# Altium integrated library uPC RAM ROM.IntLib: 33 symbols
Pins are listed as number, name and electrical type; pins without a type are passive.

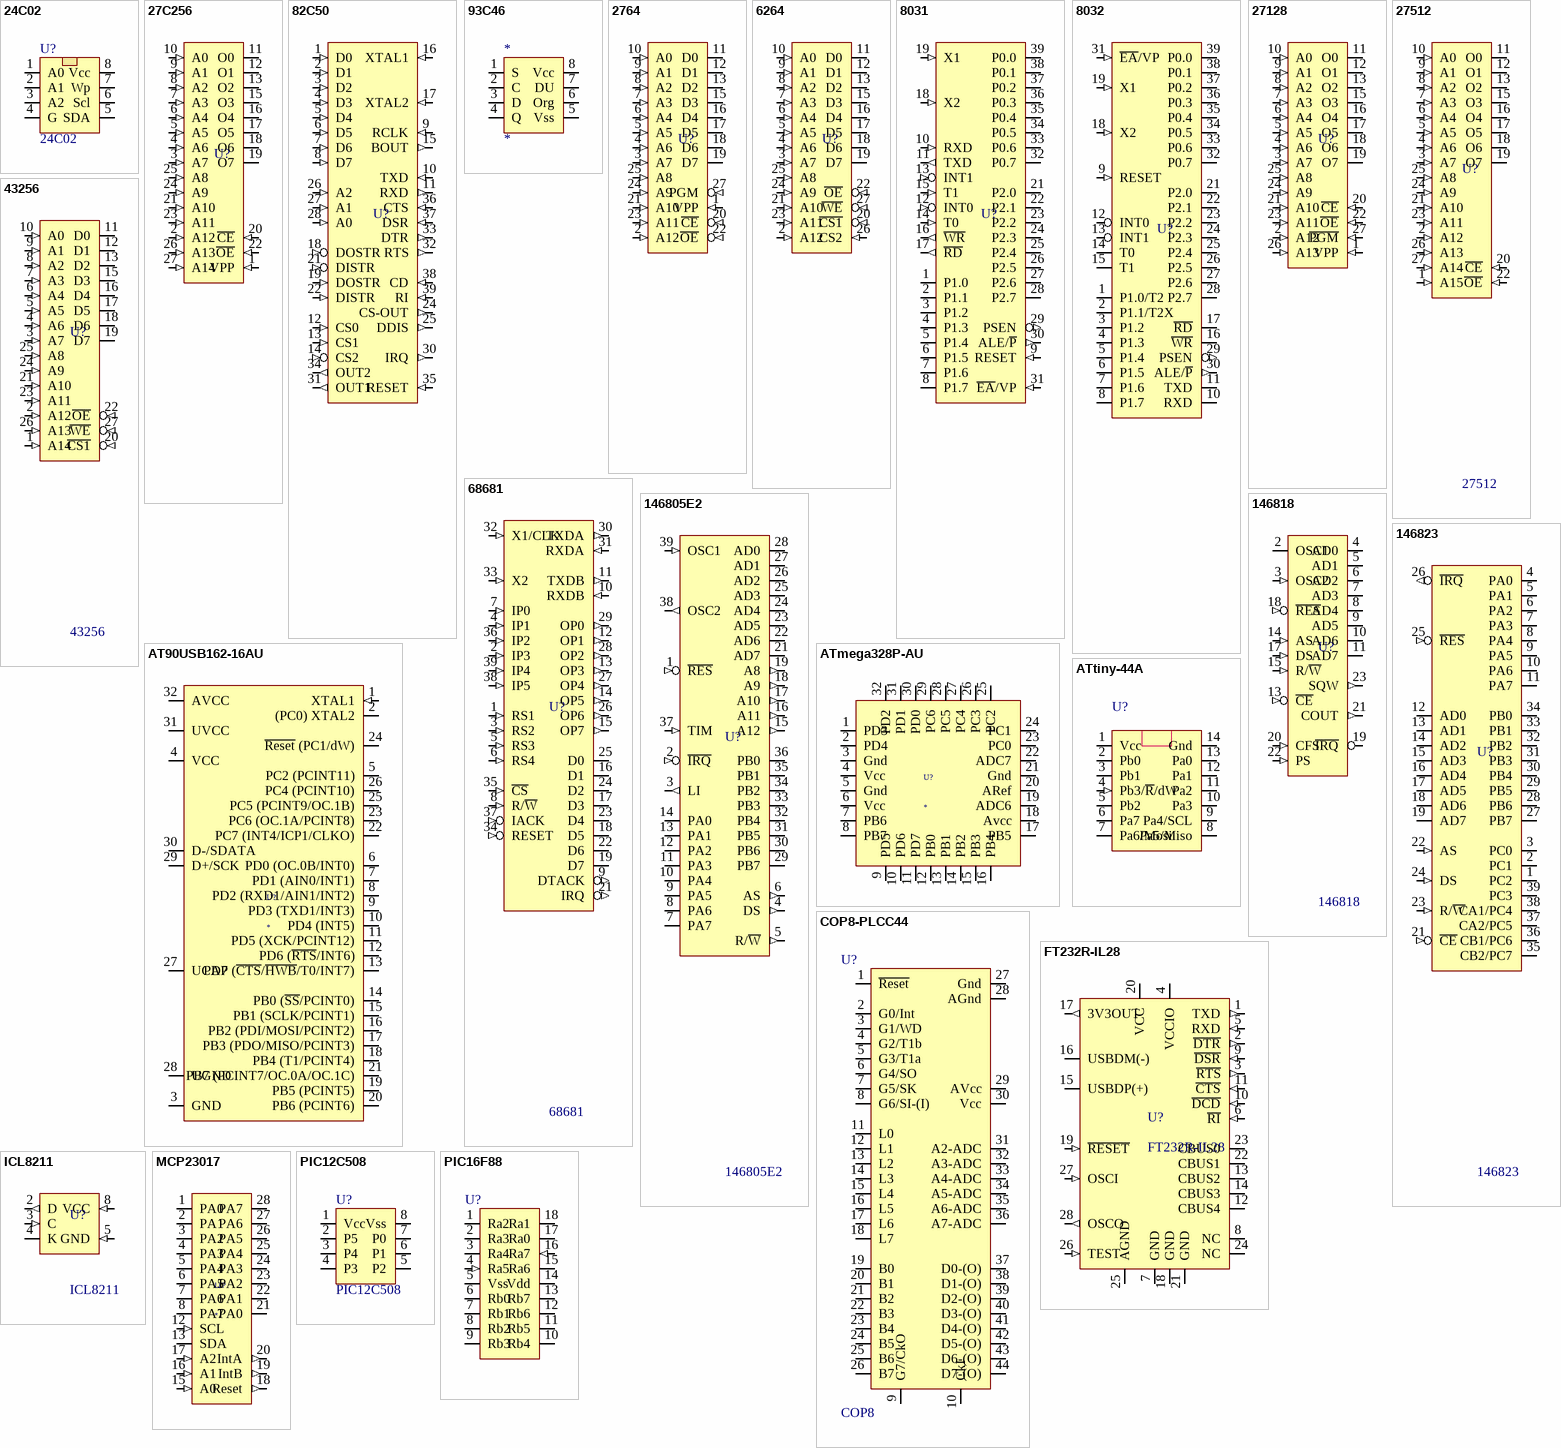
[diagram p0: symbols 24C02 to PIC16F88]

## 24C02
designator U?
footprint SO8-150
pins: 1 A0, 2 A1, 3 A2, 4 G, 5 SDA, 6 Scl, 7 Wp, 8 Vcc

## 27C256
designator U?
footprint DIL28-600
pins: 1 VPP (in), 2 A12 (in), 3 A7 (in), 4 A6 (in), 5 A5 (in), 6 A4 (in), 7 A3 (in), 8 A2 (in), 9 A1 (in), 10 A0 (in), 11 O0 (hiz), 12 O1 (hiz), 13 O2 (hiz), 14 GND (power) hidden to GND, 15 O3 (hiz), 16 O4 (hiz), 17 O5 (hiz), 18 O6 (hiz), 19 O7 (hiz), 20 ~{CE} (in), 21 A10 (in), 22 ~{OE} (in), 23 A11 (in), 24 A9 (in), 25 A8 (in), 26 A13 (in), 27 A14 (in), 28 VCC (power) hidden to VCC

## 82C50
designator U?
footprint DIL40-600
pins: 1 D0 (in), 2 D1 (in), 3 D2 (in), 4 D3 (in), 5 D4 (in), 6 D5 (in), 7 D6 (in), 8 D7 (in), 9 RCLK (in), 10 TXD (in), 11 RXD (out), 12 CS0 (in), 13 CS1 (in), 14 CS2 (in), 15 BOUT (out), 16 XTAL1 (in), 17 XTAL2 (in), 18 DOSTR (in), 19 DOSTR (in), 20 VSS (power) hidden to VSS, 21 DISTR (in), 22 DISTR (in), 24 CS-OUT (out), 25 DDIS (out), 26 A2 (in), 27 A1 (in), 28 A0 (in), 30 IRQ (out), 31 OUT1 (out), 32 RTS (out), 33 DTR (out), 34 OUT2 (out), 35 RESET (in), 36 CTS (in), 37 DSR (in), 38 CD (in), 39 RI (in), 40 VCC (power) hidden to VCC

## 93C46
designator *
footprint DIL8-300a
pins: 1 S, 2 C, 3 D, 4 Q, 5 Vss, 6 Org, 7 DU, 8 Vcc

## 2764
designator U?
footprint DIL28-600
pins: 1 VPP (in), 2 A12 (in), 3 A7 (in), 4 A6 (in), 5 A5 (in), 6 A4 (in), 7 A3 (in), 8 A2 (in), 9 A1 (in), 10 A0 (in), 11 D0 (hiz), 12 D1 (hiz), 13 D2 (hiz), 14 GND (power) hidden to GND, 15 D3 (hiz), 16 D4 (hiz), 17 D5 (hiz), 18 D6 (hiz), 19 D7 (hiz), 20 ~{CE} (in), 21 A10 (in), 22 ~{OE} (in), 23 A11 (in), 24 A9 (in), 25 A8 (in), 27 PGM (in), 28 VCC (power) hidden to VCC

## 6264
designator U?
footprint DIL28-600
pins: 2 A12 (in), 3 A7 (in), 4 A6 (in), 5 A5 (in), 6 A4 (in), 7 A3 (in), 8 A2 (in), 9 A1 (in), 10 A0 (in), 11 D0 (hiz), 12 D1 (hiz), 13 D2 (hiz), 14 GND (power) hidden to GND, 15 D3 (hiz), 16 D4 (hiz), 17 D5 (hiz), 18 D6 (hiz), 19 D7 (hiz), 20 ~{CS1} (in), 21 A10 (in), 22 ~{OE} (in), 23 A11 (in), 24 A9 (in), 25 A8 (in), 26 CS2 (in), 27 ~{WE} (in), 28 VCC (power) hidden to VCC

## 8031
designator U?
footprint DIL40-600
pins: 1 P1.0 (io), 2 P1.1 (io), 3 P1.2 (io), 4 P1.3 (io), 5 P1.4 (io), 6 P1.5 (io), 7 P1.6 (io), 8 P1.7 (io), 9 RESET (in), 10 RXD (in), 11 TXD (out), 12 INT0 (in), 13 INT1 (in), 14 T0 (in), 15 T1 (in), 16 ~{WR} (out), 17 ~{RD} (out), 18 X2 (in), 19 X1 (in), 20 GND (power) hidden to GND, 21 P2.0 (io), 22 P2.1 (io), 23 P2.2 (io), 24 P2.3 (io), 25 P2.4 (io), 26 P2.5 (io), 27 P2.6 (io), 28 P2.7 (io), 29 PSEN (out), 30 ALE/~{P} (out), 31 ~{EA}/VP (in), 32 P0.7 (io), 33 P0.6 (io), 34 P0.5 (io), 35 P0.4 (io), 36 P0.3 (io), 37 P0.2 (io), 38 P0.1 (io), 39 P0.0 (io), 40 VCC (power) hidden to VCC

## 8032
designator U?
footprint DIL40-600
pins: 1 P1.0/T2 (io), 2 P1.1/T2X (io), 3 P1.2 (io), 4 P1.3 (io), 5 P1.4 (io), 6 P1.5 (io), 7 P1.6 (io), 8 P1.7 (io), 9 RESET (in), 10 RXD (io), 11 TXD (io), 12 INT0 (io), 13 INT1 (io), 14 T0 (io), 15 T1 (io), 16 ~{WR} (io), 17 ~{RD} (io), 18 X2 (in), 19 X1 (in), 20 VSS (power) hidden to VSS, 21 P2.0 (io), 22 P2.1 (io), 23 P2.2 (io), 24 P2.3 (io), 25 P2.4 (io), 26 P2.5 (io), 27 P2.6 (io), 28 P2.7 (io), 29 PSEN (out), 30 ALE/~{P} (out), 31 ~{EA}/VP (in), 32 P0.7 (io), 33 P0.6 (io), 34 P0.5 (io), 35 P0.4 (io), 36 P0.3 (io), 37 P0.2 (io), 38 P0.1 (io), 39 P0.0 (io), 40 VDD (power) hidden to VDD

## 27128
designator U?
footprint DIL28-600
pins: 1 VPP (in), 2 A12 (in), 3 A7 (in), 4 A6 (in), 5 A5 (in), 6 A4 (in), 7 A3 (in), 8 A2 (in), 9 A1 (in), 10 A0 (in), 11 O0 (hiz), 12 O1 (hiz), 13 O2 (hiz), 14 GND (power) hidden to GND, 15 O3 (hiz), 16 O4 (hiz), 17 O5 (hiz), 18 O6 (hiz), 19 O7 (hiz), 20 ~{CE} (in), 21 A10 (in), 22 ~{OE} (in), 23 A11 (in), 24 A9 (in), 25 A8 (in), 26 A13 (in), 27 ~{PGM} (in), 28 VCC (power) hidden to VCC

## 27512
designator U?
footprint DIL28-600
pins: 1 A15 (in), 2 A12 (in), 3 A7 (in), 4 A6 (in), 5 A5 (in), 6 A4 (in), 7 A3 (in), 8 A2 (in), 9 A1 (in), 10 A0 (in), 11 O0 (hiz), 12 O1 (hiz), 13 O2 (hiz), 14 GND (power) hidden to GND, 15 O3 (hiz), 16 O4 (hiz), 17 O5 (hiz), 18 O6 (hiz), 19 O7 (hiz), 20 ~{CE} (in), 21 A10 (in), 22 ~{OE} (in), 23 A11 (in), 24 A9 (in), 25 A8 (in), 26 A13 (in), 27 A14 (in), 28 VCC (power) hidden to VCC

## 43256
designator U?
footprint DIL28-600
pins: 1 A14 (in), 2 A12 (in), 3 A7 (in), 4 A6 (in), 5 A5 (in), 6 A4 (in), 7 A3 (in), 8 A2 (in), 9 A1 (in), 10 A0 (in), 11 D0 (hiz), 12 D1 (hiz), 13 D2 (hiz), 14 GND (power) hidden to GND, 15 D3 (hiz), 16 D4 (hiz), 17 D5 (hiz), 18 D6 (hiz), 19 D7 (hiz), 20 ~{CS1} (in), 21 A10 (in), 22 ~{OE} (in), 23 A11 (in), 24 A9 (in), 25 A8 (in), 26 A13 (in), 27 ~{WE} (in), 28 ACC (power) hidden to ACC

## 68681
designator U?
footprint DIL40-600
pins: 1 RS1 (in), 2 IP3 (in), 3 RS2 (in), 4 IP1 (in), 5 RS3 (in), 6 RS4 (in), 7 IP0 (in), 8 R/~{W} (in), 9 DTACK (out), 10 RXDB (in), 11 TXDB (out), 12 OP1 (out), 13 OP3 (out), 14 OP5 (out), 15 OP7 (out), 16 D1 (io), 17 D3 (io), 18 D5 (io), 19 D7 (io), 20 GND (power) hidden to GND, 21 IRQ (out), 22 D6 (io), 23 D4 (io), 24 D2 (io), 25 D0 (io), 26 OP6 (out), 27 OP4 (out), 28 OP2 (out), 29 OP0 (out), 30 TXDA (out), 31 RXDA (in), 32 X1/CLK (in), 33 X2 (in), 34 RESET (in), 35 ~{CS} (in), 36 IP2 (in), 37 IACK (in), 38 IP5 (in), 39 IP4 (in), 40 VCC (power) hidden to VCC

## 146805E2
designator U?
footprint DIL40-600
pins: 1 ~{RES} (in), 2 ~{IRQ} (in), 3 LI (out), 4 DS (out), 5 R/~{W} (out), 6 AS (out), 7 PA7 (io), 8 PA6 (io), 9 PA5 (io), 10 PA4 (io), 11 PA3 (io), 12 PA2 (io), 13 PA1 (io), 14 PA0 (io), 15 A12 (out), 16 A11 (out), 17 A10 (out), 18 A9 (out), 19 A8 (out), 20 GND (power) hidden to GND, 21 AD7 (io), 22 AD6 (io), 23 AD5 (io), 24 AD4 (io), 25 AD3 (io), 26 AD2 (io), 27 AD1 (io), 28 AD0 (io), 29 PB7 (io), 30 PB6 (io), 31 PB5 (io), 32 PB4 (io), 33 PB3 (io), 34 PB2 (io), 35 PB1 (io), 36 PB0 (io), 37 TIM (in), 38 OSC2 (out), 39 OSC1 (in), 40 VCC (power) hidden to VCC

## 146818
designator U?
footprint DIL24-600a
pins: 2 OSC1, 3 OSC2 (in), 4 AD0 (io), 5 AD1 (io), 6 AD2 (io), 7 AD3 (io), 8 AD4 (io), 9 AD5 (io), 10 AD6 (io), 11 AD7 (io), 12 GND (power) hidden to GND, 13 ~{CE} (in), 14 AS (in), 15 R/~{W} (in), 17 DS (in), 18 ~{RES} (in), 19 ~{IRQ} (oc), 20 CFS (in), 21 COUT (out), 22 PS (in), 23 SQW (out), 24 VCC (power) hidden to Vcc

## 146823
designator U?
footprint DIL40-600
pins: 1 PC2 (io), 2 PC1 (io), 3 PC0 (io), 4 PA0 (io), 5 PA1 (io), 6 PA2 (io), 7 PA3 (io), 8 PA4 (io), 9 PA5 (io), 10 PA6 (io), 11 PA7 (io), 12 AD0 (io), 13 AD1 (io), 14 AD2 (io), 15 AD3 (io), 16 AD4 (io), 17 AD5 (io), 18 AD6 (io), 19 AD7 (io), 20 GND (power) hidden to GND, 21 ~{CE} (in), 22 AS (in), 23 R/~{W} (in), 24 DS (in), 25 ~{RES} (in), 26 ~{IRQ} (out), 27 PB7 (io), 28 PB6 (io), 29 PB5 (io), 30 PB4 (io), 31 PB3 (io), 32 PB2 (io), 33 PB1 (io), 34 PB0 (io), 35 CB2/PC7 (io), 36 CB1/PC6 (io), 37 CA2/PC5 (io), 38 CA1/PC4 (io), 39 PC3 (io), 40 VCC (power) hidden to VCC

## AT90USB162-16AU
designator U?
Price: 3.36
footprint TQFP32 7x7x0.8 (Thin QFP, 32-Leads, Body 7x7mm, Pitch 0.8mm, IPC High Density)
pins: 1 XTAL1 (in), 2 (PC0) XTAL2 (io), 3 GND (power), 4 VCC (power), 5 PC2 (PCINT11) (io), 6 PD0 (OC.0B/INT0) (io), 7 PD1 (AIN0/INT1) (io), 8 PD2 (RXD1/AIN1/INT2) (io), 9 PD3 (TXD1/INT3) (io), 10 PD4 (INT5) (io), 11 PD5 (XCK/PCINT12) (io), 12 PD6 (~{RTS}/INT6) (io), 13 PD7 (~{CTS}/~{HWB}/T0/INT7) (io), 14 PB0 (~{SS}/PCINT0) (io), 15 PB1 (SCLK/PCINT1) (io), 16 PB2 (PDI/MOSI/PCINT2) (io), 17 PB3 (PDO/MISO/PCINT3) (io), 18 PB4 (T1/PCINT4) (io), 19 PB5 (PCINT5) (io), 20 PB6 (PCINT6) (io), 21 PB7 (PCINT7/OC.0A/OC.1C) (io), 22 PC7 (INT4/ICP1/CLKO) (io), 23 PC6 (OC.1A/PCINT8) (io), 24 ~{Reset} (PC1/dW) (io), 25 PC5 (PCINT9/OC.1B) (io), 26 PC4 (PCINT10) (io), 27 UCAP (power), 28 UGND (power), 29 D+/SCK (io), 30 D-/SDATA (io), 31 UVCC (power), 32 AVCC (power)
1 alternate drawing of the same symbol

## ATmega328P-AU
designator U?
Price: 3.36
footprint TQFP32 7x7x0.8 (Thin QFP, 32-Leads, Body 7x7mm, Pitch 0.8mm, IPC High Density)
pins: 1 PD3, 2 PD4, 3 Gnd, 4 Vcc, 5 Gnd, 6 Vcc, 7 PB6, 8 PB7, 9 PD5, 10 PD6, 11 PD7, 12 PB0, 13 PB1, 14 PB2, 15 PB3, 16 PB4, 17 PB5, 18 Avcc, 19 ADC6, 20 ARef, 21 Gnd, 22 ADC7, 23 PC0, 24 PC1, 25 PC2, 26 PC3, 27 PC4, 28 PC5, 29 PC6, 30 PD0, 31 PD1, 32 PD2
1 alternate drawing of the same symbol

## ATtiny-44A
designator U?
uPC 8bit/44K
footprint SO14-150
pins: 1 Vcc (io), 2 Pb0 (io), 3 Pb1 (io), 4 Pb3/~{R}/dW (in), 5 Pb2 (power), 6 Pa7 (io), 7 Pa6/Mosi (io), 8 Pa5/Miso (io), 9 Pa4/SCL (io), 10 Pa3 (io), 11 Pa2 (io), 12 Pa1 (io), 13 Pa0 (io), 14 Gnd (power)

## COP8-PLCC44
designator U?, comment COP8
Price: 15.76
footprint PLCC-44 (PLCC; 44 Leads; Body 16.5 x 16.5 mm)
pins: 1 ~{Reset}, 2 G0/Int, 3 G1/WD, 4 G2/T1b, 5 G3/T1a, 6 G4/SO, 7 G5/SK, 8 G6/SI-(I), 9 G7/CkO, 10 CkI, 11 L0, 12 L1, 13 L2, 14 L3, 15 L4, 16 L5, 17 L6, 18 L7, 19 B0, 20 B1, 21 B2, 22 B3, 23 B4, 24 B5, 25 B6, 26 B7, 27 Gnd, 28 AGnd, 29 AVcc, 30 Vcc, 31 A2-ADC, 32 A3-ADC, 33 A4-ADC, 34 A5-ADC, 35 A6-ADC, 36 A7-ADC, 37 D0-(O), 38 D1-(O), 39 D2-(O), 40 D3-(O), 41 D4-(O), 42 D5-(O), 43 D6-(O), 44 D7-(O)

## FT232R-IL28
designator U?
COM-UART; Price: 6.24
footprint SSOP28 (Body Width 5.3mm; Pitch 0.65 mm)
pins: 1 TXD (out), 2 ~{DTR} (out), 3 ~{RTS} (out), 4 VCCIO (power), 5 RXD (in), 6 ~{RI} (in), 7 GND (power), 8 NC, 9 ~{DSR} (in), 10 ~{DCD} (in), 11 ~{CTS} (in), 12 CBUS4 (io), 13 CBUS2 (io), 14 CBUS3 (io), 15 USBDP(+) (io), 16 USBDM(-) (io), 17 3V3OUT (out), 18 GND (power), 19 ~{RESET} (in), 20 VCC (power), 21 GND (power), 22 CBUS1 (io), 23 CBUS0 (io), 24 NC, 25 AGND (power), 26 TEST (in), 27 OSCI (in), 28 OSCO (out)

## ICL8211
designator U?
footprint DIL8-300a
pins: 2 D (out), 3 C (in), 4 K (oc), 5 GND (in), 8 VCC (in)

## MCP23017
designator U?
Price: 2.3
footprint SO28-300
pins: 1 PA0, 2 PA1, 3 PA2, 4 PA3, 5 PA4, 6 PA5, 7 PA6, 8 PA7, 9 Vdd (power) hidden to Vdd, 10 Vss (power) hidden to Vss, 12 SCL (in), 13 SDA (io), 15 A0 (in), 16 A1 (in), 17 A2 (in), 18 Reset (out), 19 IntB (out), 20 IntA (out), 21 PA0, 22 PA1, 23 PA2, 24 PA3, 25 PA4, 26 PA5, 27 PA6, 28 PA7

## PIC12C508
designator U?
footprint DIL8-300a
pins: 1 Vcc, 2 P5, 3 P4, 4 P3, 5 P2, 6 P1, 7 P0, 8 Vss

## PIC16F88
designator U?
uPC
footprint SO18-300
pins: 1 Ra2 (io), 2 Ra3 (io), 3 Ra4 (io), 4 Ra5 (in), 5 Vss (power), 6 Rb0 (io), 7 Rb1 (io), 8 Rb2 (io), 9 Rb3 (io), 10 Rb4 (io), 11 Rb5 (io), 12 Rb6 (io), 13 Rb7 (io), 14 Vdd (power), 15 Ra6 (io), 16 Ra7 (in), 17 Ra0 (io), 18 Ra1 (io)

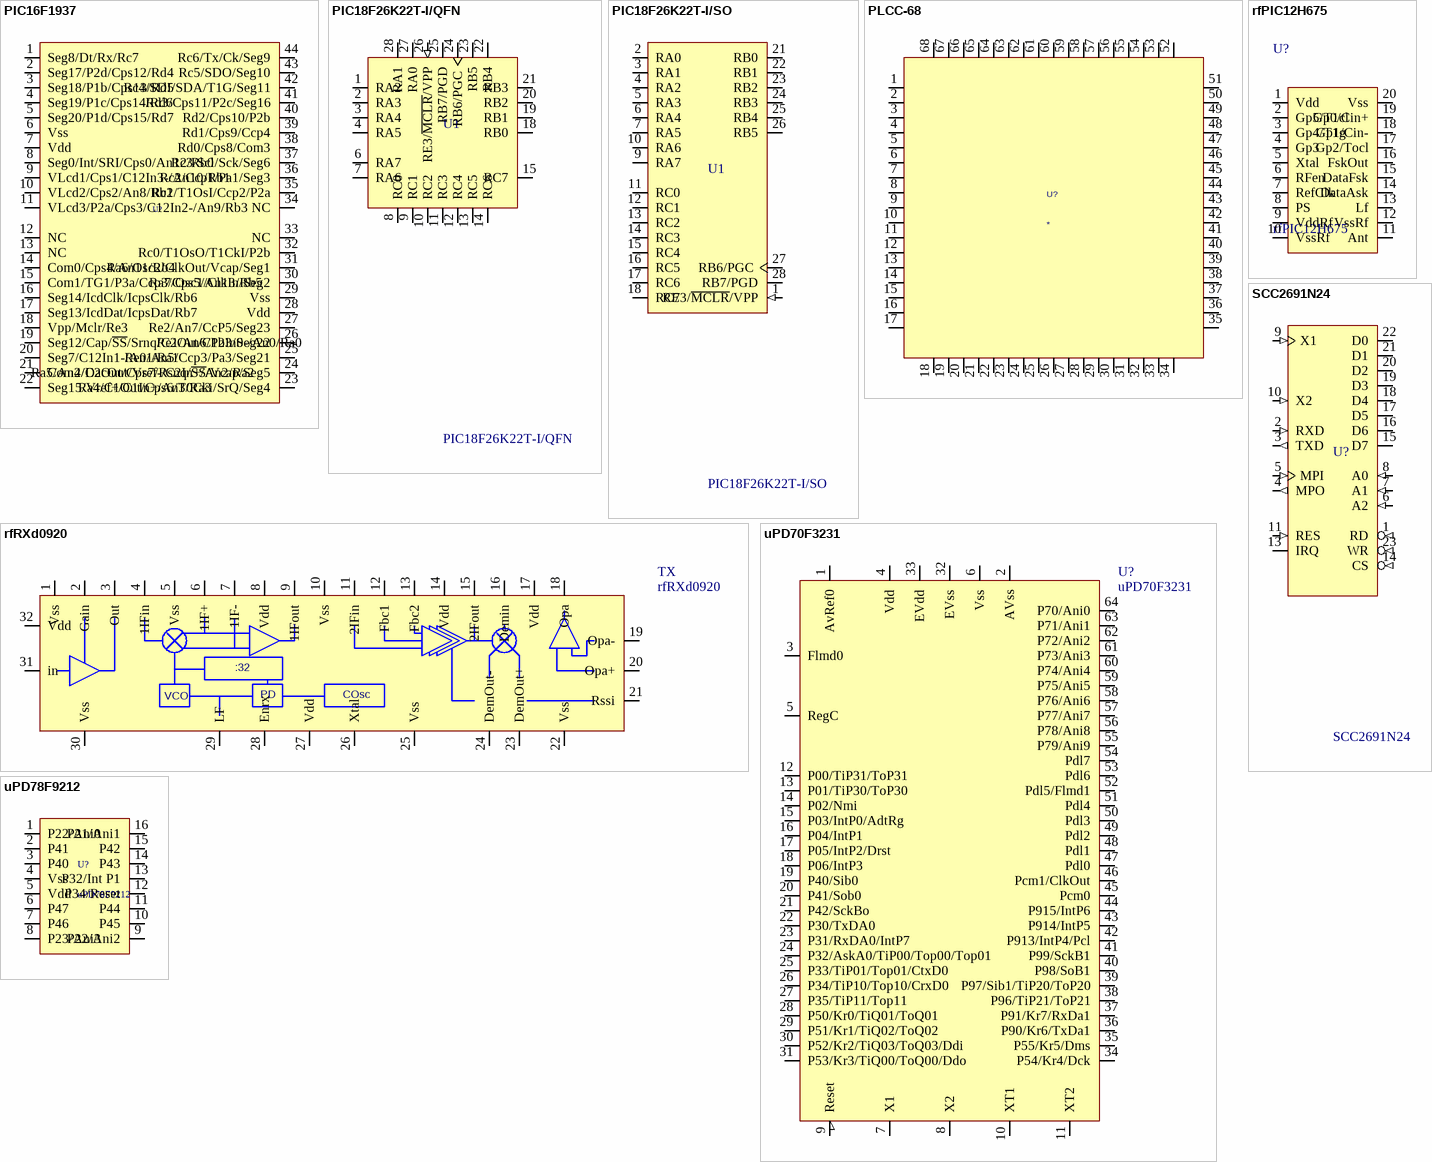
[diagram p1: symbols PIC16F1937 to uPD78F9212]

## PIC16F1937
designator U?
Price: 3.94
footprint TQFP44 10x10x0.8
pins: 1 Seg8/Dt/Rx/Rc7, 2 Seg17/P2d/Cps12/Rd4, 3 Seg18/P1b/Cps13/Rd5, 4 Seg19/P1c/Cps14/Rd6, 5 Seg20/P1d/Cps15/Rd7, 6 Vss, 7 Vdd, 8 Seg0/Int/SRI/Cps0/An12/Rb0, 9 VLcd1/Cps1/C12In3-/An10/Rb1, 10 VLcd2/Cps2/An8/Rb2, 11 VLcd3/P2a/Cps3/C12In2-/An9/Rb3, 12 NC, 13 NC, 14 Com0/Cps4/An11/Rb4, 15 Com1/TG1/P3a/Ccp3/Cps5/An13/Rb5, 16 Seg14/IcdClk/IcpsClk/Rb6, 17 Seg13/IcdDat/IcpsDat/Rb7, 18 Vpp/Mclr/Re3, 19 Seg12/Cap/~{SS}/Srnq/C2Out/C12In0-/An0/Ra0, 20 Seg7/C12In1-/An1/Ra1, 21 Com2/DacOut/Vref-/C2In+/An2/Ra2, 22 Seg15/Vref+/C1In+/An3/Ra3, 23 Ra4/C1Out/Cps6/T0Cki/SrQ/Seg4, 24 Ra5/An4/C2Out/Cps7/Rsnq/~{SS}/Vcap/Seg5, 25 Re0/An5/Ccp3/Pa3/Seg21, 26 Re1/An6/Pb3/Seg22, 27 Re2/An7/CcP5/Seg23, 28 Vdd, 29 Vss, 30 Ra7/Osc1/ClkIn/Seg2, 31 Ra6/Osc2/ClkOut/Vcap/Seg1, 32 Rc0/T1OsO/T1CkI/P2b, 33 NC, 34 NC, 35 Rc1/T1OsI/Ccp2/P2a, 36 Rc2/Ccp1/Pa1/Seg3, 37 Rc3/Scl/Sck/Seg6, 38 Rd0/Cps8/Com3, 39 Rd1/Cps9/Ccp4, 40 Rd2/Cps10/P2b, 41 Rd3/Cps11/P2c/Seg16, 42 Rc4/SDI/SDA/T1G/Seg11, 43 Rc5/SDO/Seg10, 44 Rc6/Tx/Ck/Seg9

## PIC18F26K22T-I/QFN
designator U1
PartNumber: PIC18F26K22T-I/SO; Manufacturer: Microchip; Timers: 3 - 8-bit, 4 - 16-bit; Program Memory KWords: 32; # of A/D Channels: 17; Max. CPU Speed MHz: 64; Internal Oscillator: 16 MHz, 31 kHz; Packing: T/R; EEPROM Data Memory (bytes): 1024; Operation Voltage Range: 2.3V - 5.5V; Digital Communication: 0 -UART, 2 -A/E/USART, 2 -MSSP(SPI/I2C); Memory Type: Flash; RAM: 3896; I/O Pins: 24; ComponentLink1Description: Datasheet; PackageVersion: C04-052C, 12/2012; ComponentLink3URL: Product URL:http://www.microchip.com/datasheet/PIC18F26K22; DatasheetVersion: Rev. F; Program Memory KBytes: 64; ComponentLink2Description: Package Specification; ComponentLink2URL: http://www.microchip.com/stellent/groups/techpub_sg/documents/packagingspec/en012702.pdf; PackageDescription: 28-Lead Plastic Small Outline, 17.9 x 7.5 mm Body, 1.27 mm Pitch; PackageReference: SOIC-SO28; Mounting Technology: Surface Mount; ComponentLink1URL: http://ww1.microchip.com/downloads/en/DeviceDoc/41412F.pdf; ComponentLink3Description: URL Link1; RoHS: TRUE
footprint QFN28N - 6x6x0.65 (28-Pin Plastic Quad Flat No-Lead 0.65 mm Pitch, IPC Medium Density)
pins: 1 RA2 (io), 2 RA3 (io), 3 RA4 (io), 4 RA5 (io), 5 VSS (power) hidden to Vss "Ground reference for logic and I/O pins.", 6 RA7 (io), 7 RA6 (io), 8 RC0 (io), 9 RC1 (io), 10 RC2 (io), 11 RC3 (io), 12 RC4 (io), 13 RC5 (io), 14 RC6 (io), 15 RC7 (io), 16 VSS (power) hidden to Vss "Ground reference for logic and I/O pins.", 17 VDD (power) hidden to Vdd "Positive supply for logic and I/O pins.", 18 RB0 (io), 19 RB1 (io), 20 RB2 (io), 21 RB3 (io), 22 RB4 (io), 23 RB5 (io), 24 RB6/PGC (io), 25 RB7/PGD (io), 26 RE3/~{MCLR}/VPP (in), 27 RA0 (io), 28 RA1 (io)

## PIC18F26K22T-I/SO
designator U1
Manufacturer: Microchip; Timers: 3 - 8-bit, 4 - 16-bit; Program Memory KWords: 32; # of A/D Channels: 17; Max. CPU Speed MHz: 64; Internal Oscillator: 16 MHz, 31 kHz; Packing: T/R; EEPROM Data Memory (bytes): 1024; Operation Voltage Range: 2.3V - 5.5V; Digital Communication: 0 -UART, 2 -A/E/USART, 2 -MSSP(SPI/I2C); Memory Type: Flash; RAM: 3896; I/O Pins: 24; PartNumber: PIC18F26K22T-I/SO; ComponentLink1Description: Datasheet; PackageVersion: C04-052C, 12/2012; ComponentLink3URL: Product URL:http://www.microchip.com/datasheet/PIC18F26K22; DatasheetVersion: Rev. F; Program Memory KBytes: 64; ComponentLink2Description: Package Specification; ComponentLink2URL: http://www.microchip.com/stellent/groups/techpub_sg/documents/packagingspec/en012702.pdf; PackageDescription: 28-Lead Plastic Small Outline, 17.9 x 7.5 mm Body, 1.27 mm Pitch; PackageReference: SOIC-SO28; Mounting Technology: Surface Mount; ComponentLink1URL: http://ww1.microchip.com/downloads/en/DeviceDoc/41412F.pdf; ComponentLink3Description: URL Link1; RoHS: TRUE
footprint SO28-300
pins: 1 RE3/~{MCLR}/VPP (in), 2 RA0 (io), 3 RA1 (io), 4 RA2 (io), 5 RA3 (io), 6 RA4 (io), 7 RA5 (io), 8 VSS (power) hidden to Vss "Ground reference for logic and I/O pins.", 9 RA7 (io), 10 RA6 (io), 11 RC0 (io), 12 RC1 (io), 13 RC2 (io), 14 RC3 (io), 15 RC4 (io), 16 RC5 (io), 17 RC6 (io), 18 RC7 (io), 19 VSS (power) hidden to Vss "Ground reference for logic and I/O pins.", 20 VDD (power) hidden to Vdd "Positive supply for logic and I/O pins.", 21 RB0 (io), 22 RB1 (io), 23 RB2 (io), 24 RB3 (io), 25 RB4 (io), 26 RB5 (io), 27 RB6/PGC (io), 28 RB7/PGD (io)

## PLCC-68
designator U?
footprint PLCC-68 (PLCC; 68 Leads; Body 24.2 x 24.2 mm)
pins: 1, 2, 3, 4, 5, 6, 7, 8, 9, 10, 11, 12, 13, 14, 15, 16, 17, 18, 19, 20, 21, 22, 23, 24, 25, 26, 27, 28, 29, 30, 31, 32, 33, 34, 35, 36, 37, 38, 39, 40, 41, 42, 43, 44, 45, 46, 47, 48, 49, 50, 51, 52, 53, 54, 55, 56, 57, 58, 59, 60, 61, 62, 63, 64, 65, 66, 67, 68

## rfPIC12H675
designator U?
Tx uPC; Price: 5.2
footprint SSOP20
pins: 1 Vdd, 2 Gp5/T1cl, 3 Gp4/T1g, 4 Gp3, 5 Xtal, 6 RFen, 7 RefClk, 8 PS, 9 VddRf, 10 VssRf, 11 Ant, 12 VssRf, 13 Lf, 14 DataAsk, 15 DataFsk, 16 FskOut, 17 Gp2/Tocl, 18 Gp1/Cin-, 19 Gp0/Cin+, 20 Vss

## rfRXd0920
designator TX
Rx; Price: 6.53
footprint LQFP-32-0.8
pins: 1 Vss, 2 Gain, 3 Out, 4 1IFin, 5 Vss, 6 1IF+, 7 1IF-, 8 Vdd, 9 1IFout, 10 Vss, 11 2IFin, 12 Fbc1, 13 Fbc2, 14 Vdd, 15 2IFout, 16 Demin, 17 Vdd, 18 Opa, 19 Opa-, 20 Opa+, 21 Rssi, 22 Vss, 23 DemOut+, 24 DemOut-, 25 Vss, 26 Xtal, 27 Vdd, 28 Enrx, 29 LF, 30 Vss, 31 in, 32 Vdd
text: :32; VCO; PD; COsc

## SCC2691N24
designator U?
footprint DIL24-300
pins: 1 RD (in), 2 RXD (in), 3 TXD (out), 4 MPO (out), 5 MPI (in), 6 A2 (in), 7 A1 (in), 8 A0 (in), 9 X1 (in), 10 X2 (in), 11 RES (in), 12 GND (power) hidden to GND, 13 IRQ (oc), 14 CS (in), 15 D7 (hiz), 16 D6 (hiz), 17 D5 (hiz), 18 D4 (hiz), 19 D3 (hiz), 20 D2 (hiz), 21 D1 (hiz), 22 D0 (hiz), 23 WR (in), 24 VCC (power) hidden to VCC

## uPD70F3231
designator U?
footprint F-QFP10x10-G64/N
pins: 1 AvRef0, 2 AVss, 3 Flmd0, 4 Vdd, 5 RegC, 6 Vss, 7 X1, 8 X2, 9 Reset, 10 XT1, 11 XT2, 12 P00/TiP31/ToP31, 13 P01/TiP30/ToP30, 14 P02/Nmi, 15 P03/IntP0/AdtRg, 16 P04/IntP1, 17 P05/IntP2/Drst, 18 P06/IntP3, 19 P40/Sib0, 20 P41/Sob0, 21 P42/SckBo, 22 P30/TxDA0, 23 P31/RxDA0/IntP7, 24 P32/AskA0/TiP00/Top00/Top01, 25 P33/TiP01/Top01/CtxD0, 26 P34/TiP10/Top10/CrxD0, 27 P35/TiP11/Top11, 28 P50/Kr0/TiQ01/ToQ01, 29 P51/Kr1/TiQ02/ToQ02, 30 P52/Kr2/TiQ03/ToQ03/Ddi, 31 P53/Kr3/TiQ00/ToQ00/Ddo, 32 EVss, 33 EVdd, 34 P54/Kr4/Dck, 35 P55/Kr5/Dms, 36 P90/Kr6/TxDa1, 37 P91/Kr7/RxDa1, 38 P96/TiP21/ToP21, 39 P97/Sib1/TiP20/ToP20, 40 P98/SoB1, 41 P99/SckB1, 42 P913/IntP4/Pcl, 43 P914/IntP5, 44 P915/IntP6, 45 Pcm0, 46 Pcm1/ClkOut, 47 Pdl0, 48 Pdl1, 49 Pdl2, 50 Pdl3, 51 Pdl4, 52 Pdl5/Flmd1, 53 Pdl6, 54 Pdl7, 55 P79/Ani9, 56 P78/Ani8, 57 P77/Ani7, 58 P76/Ani6, 59 P75/Ani5, 60 P74/Ani4, 61 P73/Ani3, 62 P72/Ani2, 63 P71/Ani1, 64 P70/Ani0

## uPD78F9212
designator U?
footprint SSOP16 (p0.65mm)
pins: 1 P22/Ani0, 2 P41, 3 P40, 4 Vss, 5 Vdd, 6 P47, 7 P46, 8 P23/Ani3, 9 P22/Ani2, 10 P45, 11 P44, 12 P34/Reset, 13 P32/Int P1, 14 P43, 15 P42, 16 P21/Ani1